# Altium schematic symbol library LATTICEPLDS_Library.SchLib: 291 symbols (part 14 of 32)
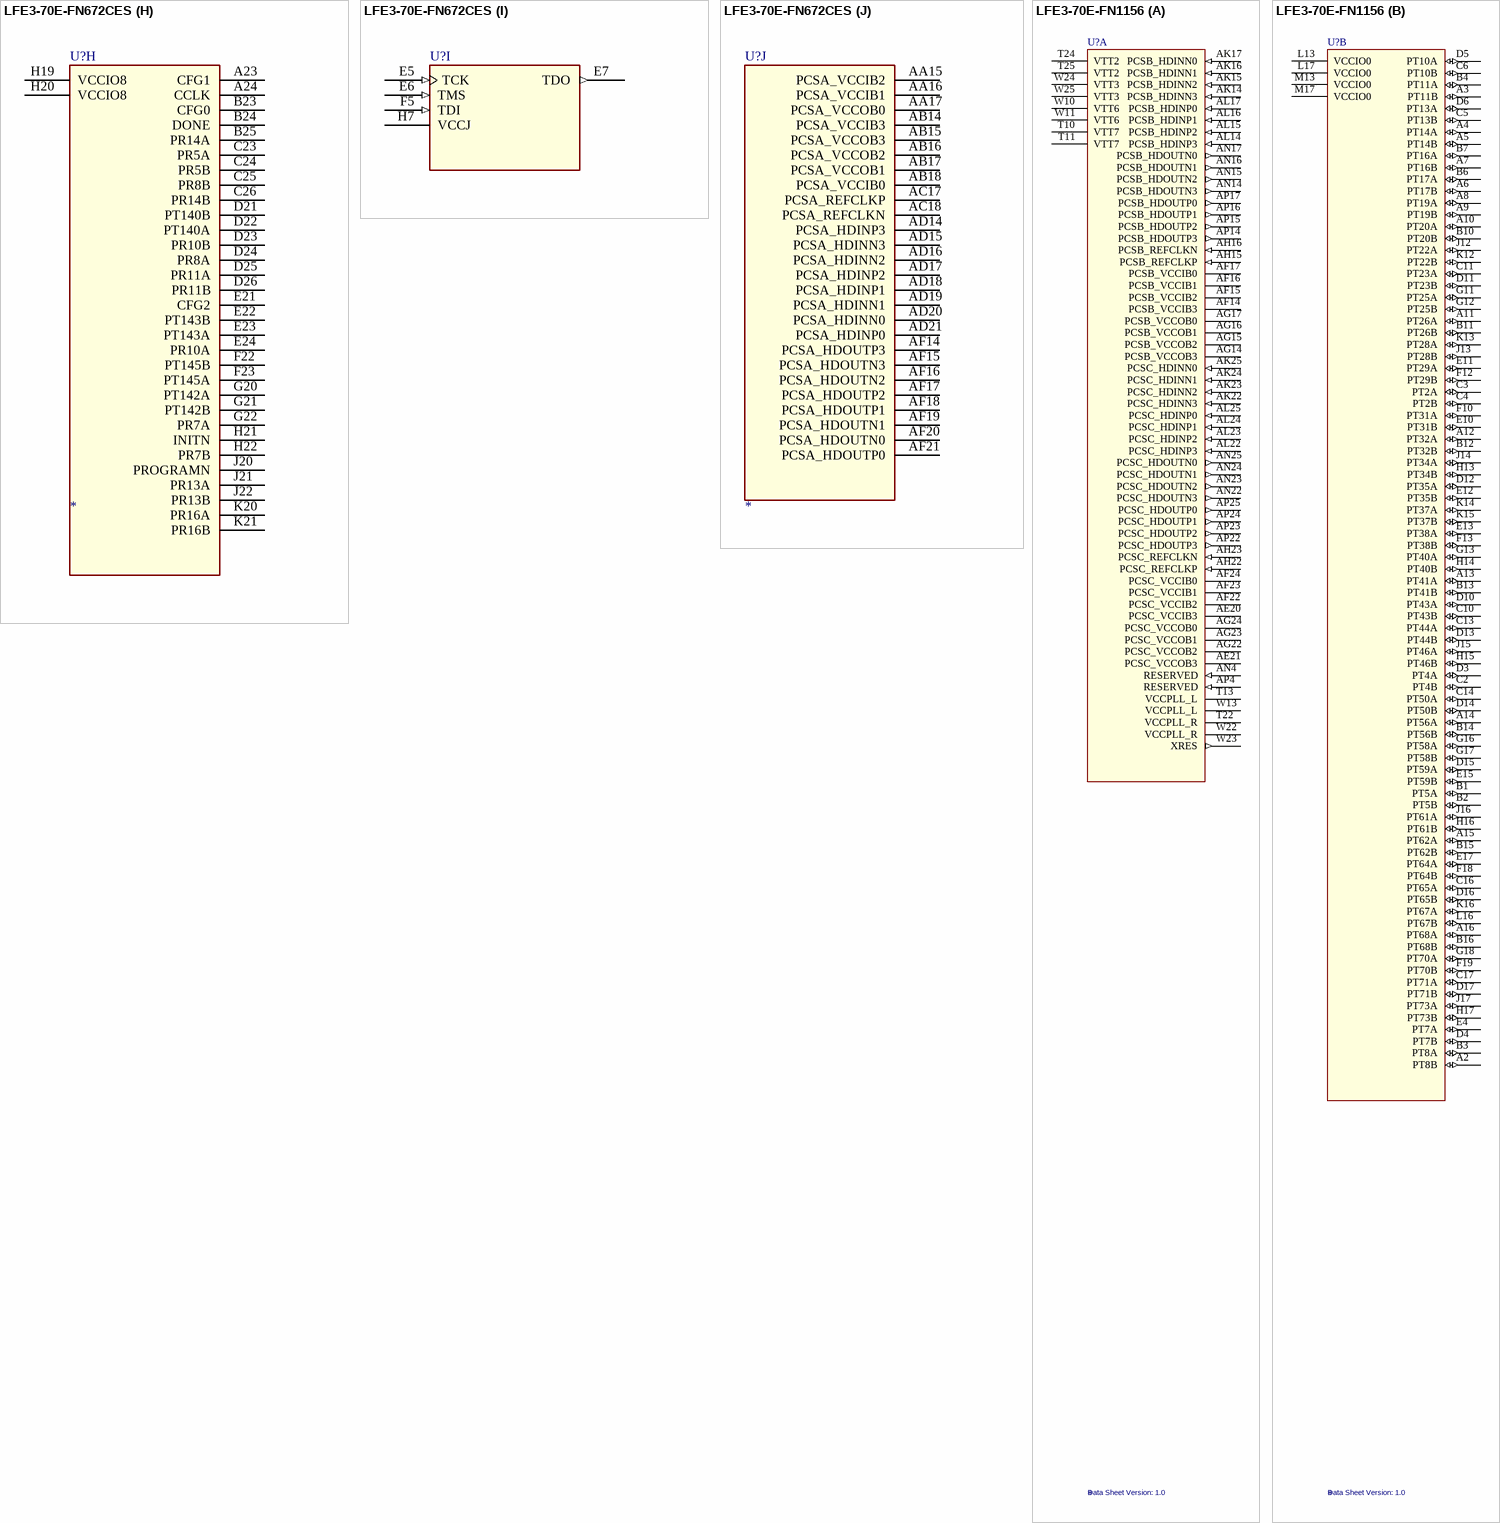
[diagram p316: symbols LFE3-70E-FN672CES to LFE3-70E-FN1156]

## LFE3-70E-FN672CES
designator U?  Data Sheet Version: 1.0
SPLIT_INST: TRUE; SWAP_INFO: (S1+S2+S3+S4+S5+S6+S7+S8+S9+S10)
part A pins: A2 GND (power), A25 GND (power), AA6 GND (power), AA8 GND (power), AA9 GND (power), AA10 PCSB_VCCOB3, AA11 PCSB_VCCIB2, AA12 PCSB_VCCOB1, AA13 GND (power), AA14 GND (power), AA18 GND (power), AA19 GND (power), AA21 GND (power), AB2 GND (power), AB8 GND (power), AB9 PCSB_VCCIB3, AB10 PCSB_VCCOB2, AB11 PCSB_VCCIB1, AB12 PCSB_VCCOB0, AB13 PCSB_VCCIB0, AB19 GND (power), AB25 GND (power), AC5 GND (power), AC6 GND (power), AC7 GND (power), AC8 GND (power), AC9 PCSB_REFCLKP, AC10 PCSB_REFCLKN, AC11 GND (power), AC12 GND (power), AC13 GND (power), AC14 GND (power), AC15 GND (power), AC16 GND (power), AC19 GND (power), AC20 GND (power), AC21 GND (power), AC22 GND (power), AD5 GND (power), AD6 PCSB_HDINP3, AD7 PCSB_HDINN3, AD8 PCSB_HDINN2, AD9 PCSB_HDINP2, AD10 PCSB_HDINP1, AD11 PCSB_HDINN1, AD12 PCSB_HDINN0, AD13 PCSB_HDINP0, AD22 GND (power), AE1 GND (power), AE5 GND (power), AE6 GND (power), AE7 GND (power), AE8 GND (power), AE9 GND (power), AE10 GND (power), AE11 GND (power), AE12 GND (power), AE13 GND (power), AE14 GND (power), AE15 GND (power), AE16 GND (power), AE17 GND (power), AE18 GND (power), AE19 GND (power), AE20 GND (power), AE21 GND (power), AE22 GND (power), AE26 GND (power), AF2 GND (power), AF5 GND (power), AF6 PCSB_HDOUTP3, AF7 PCSB_HDOUTN3, AF8 PCSB_HDOUTN2, AF9 PCSB_HDOUTP2, AF10 PCSB_HDOUTP1, AF11 PCSB_HDOUTN1, AF12 PCSB_HDOUTN0, AF13 PCSB_HDOUTP0, AF22 GND (power), AF25 GND (power), B1 GND (power), B5 GND (power), B9 GND (power), B14 GND (power), B18 GND (power), B22 GND (power), B26 GND (power), D7 GND (power), D11 GND (power), D16 GND (power), D20 GND (power), E2 GND (power), E25 GND (power), F6 GND (power), F21 GND (power), G4 GND (power), G12 GND (power), G15 GND (power), G23 GND (power), H9 GND (power), H18 GND (power), J2 GND (power), J8 GND (power), J9 VCCAUX, J11 VCCAUX, J12 GND (power), J15 GND (power), J16 VCCAUX, J18 VCCAUX, J19 GND (power), J25 GND (power), K10 GND (power), K11 VCC, K12 VCC, K13 VCC, K14 VCC, K15 VCC, K16 VCC, K17 GND (power), L4 GND (power), L9 VCCAUX, L10 VCC, L11 VCC, L12 VCC, L13 GND (power), L14 GND (power), L15 VCC, L16 VCC, L17 VCC, L18 VCCAUX, L23 GND (power), M7 GND (power), M9 GND (power), M10 VCCPLL_L, M11 VCC, M12 GND (power), M13 GND (power), M14 GND (power), M15 GND (power), M16 VCC, M17 VCCPLL_R, M18 GND (power), M20 GND (power), N2 GND (power), N7 VTT7 (power), N10 VCC, N11 GND (power), N12 GND (power), N13 GND (power), N14 GND (power), N15 GND (power), N16 GND (power), N17 VCC, N20 VTT2 (power), P7 VTT6 (power), P10 VCC, P11 GND (power), P12 GND (power), P13 GND (power), P14 GND (power), P15 GND (power), P16 GND (power), P17 VCC, P20 VTT3 (power), P25 GND (power), R7 GND (power), R9 GND (power), R10 VCCPLL_L, R11 VCC, R12 GND (power), R13 GND (power), R14 GND (power), R15 GND (power), R16 VCC, R17 VCCPLL_R, R18 XRES, R20 GND (power), T4 GND (power), T9 VCCAUX, T10 VCC, T11 VCC, T12 VCC, T13 GND (power), T14 GND (power), T15 VCC, T16 VCC, T17 VCC, T18 VCCAUX, T19 GND (power), T23 GND (power), U10 RESERVED, U11 VCC, U12 VCC, U13 VCC, U14 VCC, U15 VCC, U16 VCC, U17 GND (power), V2 GND (power), V8 RESERVED, V9 VCCAUX, V11 VCCAUX, V12 GND (power), V13 VCCA, V14 VCCA, V15 GND (power), V16 VCCAUX, V18 VCCAUX, V19 GND (power), V25 GND (power), W11 GND (power), W12 VCCA, W13 VCCA, W14 VCCA, W15 VCCA, W16 GND (power), Y4 GND (power), Y9 GND (power), Y10 GND (power), Y11 GND (power), Y12 GND (power), Y13 VCCA, Y14 VCCA, Y15 GND (power), Y16 GND (power), Y17 GND (power), Y18 GND (power), Y23 GND (power)
part B pins: A3 PT11A, A4 PT11B, A5 PT17A, A6 PT17B, A7 PT14B, A8 PT41A, A9 PT56A, A10 PT59A, A11 PT59B, A12 PT65A, A13 PT68A, A14 PT68B, A15 PT71A, A16 PT71B, B4 PT7B, B6 PT2A, B7 PT14A, B8 PT41B, B10 PT56B, B11 PT62A, B12 PT62B, B13 PT65B, C4 PT4B, C5 PT7A, C6 PT5B, C7 PT2B, C8 PT8B, C9 PT44A, C10 PT44B, C11 PT61B, C12 PT67A, C13 PT67B, D5 PT4A, D6 PT5A, D8 PT8A, D9 PT38A, D10 PT38B, D12 PT61A, D13 PT73B, E8 PT16A, E9 PT16B, E10 PT40B, E11 PT64A, E12 PT64B, E13 PT73A, F7 PT13A, F8 PT13B, F9 PT19B, F10 PT40A, F11 PT58A, F12 PT70A, G7 PT10A, G8 PT19A, G9 PT43B, G10 PT43A, G11 PT58B, G13 PT70B, H8 PT10B, H10 PT46A, H11 PT46B, H12 VCCIO0 (power), H13 VCCIO0 (power), J10 VCCIO0 (power), J13 VCCIO0 (power)
part C pins: A17 PT80A, A18 PT80B, A19 PT83A, A20 PT83B, A21 PT86A, A22 PT131B, B15 PT74B, B16 PT77A, B17 PT82A, B19 PT89B, B20 PT86B, B21 PT131A, C14 PT76A, C15 PT74A, C16 PT77B, C17 PT82B, C18 PT107A, C19 PT104A, C20 PT89A, C21 PT134B, C22 PT134A, D14 PT76B, D15 PT91A, D17 PT130B, D18 PT107B, D19 PT104B, E14 PT85A, E15 PT85B, E16 PT91B, E17 PT101A, E18 PT130A, E19 PT128A, E20 PT128B, F13 PT79A, F14 PT79B, F15 PT88B, F16 PT103B, F17 PT109A, F18 PT101B, F19 PT133A, F20 PT133B, G14 PT88A, G16 PT103A, G17 PT109B, G18 PT136A, G19 PT136B, H14 VCCIO1 (power), H15 VCCIO1 (power), H16 PT106A, H17 PT106B, J14 VCCIO1 (power), J17 VCCIO1 (power)
part D pins: E26 PR25E_B, F24 PR22A, F25 PR25E_A, F26 PR20B, G24 PR22B, G25 PR26B, G26 PR20A, H23 PR19B, H24 PR26A, H25 PR23B, H26 PR23A, J23 PR19A, J24 PR29B, J26 PR35A, K18 VCCIO2 (power), K19 PR38A, K22 PR25B, K23 PR25A, K24 PR29A, K25 PR32B, K26 PR35B, L19 PR38B, L20 PR28A, L21 PR25E_C, L22 PR25E_D, L24 PR32A, L25 PR41A, L26 PR41B, M19 VCCIO2 (power), M21 PR28B, M22 PR34A, M23 PR31A, M24 PR31B, M25 PR43E_A, M26 PR43E_B, N18 VCCIO2 (power), N19 VCCIO2 (power), N21 PR34B, N22 PR37B, N23 PR37A, P21 PR43A, P22 PR43B, P23 PR40A, R21 PR43E_D, R22 PR40B, T21 PR43E_C
part E pins: AA20 PB145B, AA22 PR94B, AA23 PR88B, AA24 PR88A, AA25 PR80A, AA26 PR83A, AB20 PB139A, AB21 PB139B, AB22 PB143B, AB23 PB143A, AB24 PR92A, AB26 PR83B, AC23 PB137B, AC24 PR92B, AC25 PR89B, AC26 PR89A, AD23 PB137A, AD24 PR97A, AD25 PR86B, AD26 PR86A, AE23 PB140B, AE24 PR97B, AE25 PR95A, AF23 PB140A, AF24 PR95B, N24 PR44A, N25 PR44B, N26 PR50A, P18 VCCIO3 (power), P19 VCCIO3 (power), P24 PR47A, P26 PR50B, R19 VCCIO3 (power), R23 PR49A, R24 PR47B, R25 PR53A, R26 PR53B, T20 PR52A, T22 PR49B, T24 PR56B, T25 PR56A, T26 PR59A, U18 VCCIO3 (power), U19 PR46B, U20 PR46A, U21 PR52B, U22 PR61B, U23 PR61A, U24 PR55A, U25 PR61E_A, U26 PR59B, V17 PR79E_C, V20 PR61E_C, V21 PR58A, V22 PR58B, V23 PR79E_A, V24 PR55B, V26 PR61E_B, W17 PB142A, W18 PR79E_D, W19 PR61E_D, W20 PR85B, W21 PR85A, W22 PR82B, W23 PR82A, W24 PR79E_B, W25 PR70E_B, W26 PR70E_A, Y19 PR91A, Y20 PR91B, Y21 PB145A, Y22 PR94A, Y24 PR80B, Y25 PR70E_D, Y26 PR70E_C
part F pins: AA1 PL80A, AA2 PL80B, AA3 PL89A, AA4 PL89B, AA5 PL88B, AA7 PB4A, AB1 PL83A, AB3 PL92A, AB4 PL92B, AB5 PL91A, AB6 PL91B, AB7 PB4B, AC1 PL83B, AC2 PL86A, AC3 PL86B, AC4 PB5B, AD1 PL95A, AD2 PL95B, AD3 PB5A, AD4 PB2A, AE2 PB8A, AE3 PB2B, AE4 PB11A, AF3 PB8B, AF4 PB11B, N3 PL49A, N5 PL46A, N6 PL46B, P1 PL44A, P2 PL44B, P3 PL49B, P4 PL53A, P5 PL52A, P6 PL52B, P8 VCCIO6 (power), P9 VCCIO6 (power), R1 PL47A, R2 PL47B, R3 PL53B, R4 PL58B, R5 PL55A, R6 PL55B, R8 VCCIO6 (power), T1 PL56A, T2 PL50A, T3 PL58A, T5 PL64A, T6 PL64B, T7 PL61A, T8 PL61B, U1 PL56B, U2 PL59B, U3 PL50B, U4 PL61E_C, U5 PL70E_D, U6 PL70E_C, U7 PL79E_C, U8 PL79E_D, U9 VCCIO6 (power), V1 PL59A, V3 PL65A, V4 PL65B, V5 PL61E_D, V6 PL82A, V7 PL82B, V10 PB13A, W1 PL61E_A, W2 PL61E_B, W3 PL62B, W4 PL70E_A, W5 PL70E_B, W6 PL85B, W7 PL85A, W8 PL97A, W9 PL97B, W10 PB13B, Y1 PL79E_A, Y2 PL79E_B, Y3 PL62A, Y5 PL88A, Y6 PL94A, Y7 PL94B, Y8 PB10A
part G pins: B2 PL8A, B3 PL8B, C1 PL29B, C2 PL17A, C3 PL11A, D1 PL29A, D2 PL17B, D3 PL11B, D4 PL10A, E1 PL32A, E3 PL14A, E4 PL10B, F1 PL32B, F2 PL20A, F3 PL20B, F4 PL14B, G1 PL35B, G2 PL23A, G3 PL23B, G5 PL13A, G6 PL13B, H1 PL38A, H2 PL35A, H3 PL25E_B, H4 PL25E_A, H5 PL25A, H6 PL16A, J1 PL38B, J3 PL28B, J4 PL28A, J5 PL25B, J6 PL16B, J7 PL19B, K1 PL26B, K2 PL26A, K3 PL37A, K4 PL31A, K5 PL31B, K6 PL22B, K7 PL22A, K8 PL19A, K9 VCCIO7 (power), L1 PL41B, L2 PL41A, L3 PL37B, L5 PL34A, L6 PL34B, L7 PL25E_D, L8 PL25E_C, M1 PL43E_A, M2 PL43E_D, M3 PL43E_C, M4 PL43A, M5 PL40A, M6 PL40B, M8 VCCIO7 (power), N1 PL43E_B, N4 PL43B, N8 VCCIO7 (power), N9 VCCIO7 (power)
part H pins: A23 CFG1, A24 CCLK, B23 CFG0, B24 DONE, B25 PR14A, C23 PR5A, C24 PR5B, C25 PR8B, C26 PR14B, D21 PT140B, D22 PT140A, D23 PR10B, D24 PR8A, D25 PR11A, D26 PR11B, E21 CFG2, E22 PT143B, E23 PT143A, E24 PR10A, F22 PT145B, F23 PT145A, G20 PT142A, G21 PT142B, G22 PR7A, H19 VCCIO8 (power), H20 VCCIO8 (power), H21 INITN, H22 PR7B, J20 PROGRAMN, J21 PR13A, J22 PR13B, K20 PR16A, K21 PR16B
part I pins: E5 TCK (in), E6 TMS (in), E7 TDO (out), F5 TDI (in), H7 VCCJ (power)
part J pins: AA15 PCSA_VCCIB2, AA16 PCSA_VCCIB1, AA17 PCSA_VCCOB0, AB14 PCSA_VCCIB3, AB15 PCSA_VCCOB3, AB16 PCSA_VCCOB2, AB17 PCSA_VCCOB1, AB18 PCSA_VCCIB0, AC17 PCSA_REFCLKP, AC18 PCSA_REFCLKN, AD14 PCSA_HDINP3, AD15 PCSA_HDINN3, AD16 PCSA_HDINN2, AD17 PCSA_HDINP2, AD18 PCSA_HDINP1, AD19 PCSA_HDINN1, AD20 PCSA_HDINN0, AD21 PCSA_HDINP0, AF14 PCSA_HDOUTP3, AF15 PCSA_HDOUTN3, AF16 PCSA_HDOUTN2, AF17 PCSA_HDOUTP2, AF18 PCSA_HDOUTP1, AF19 PCSA_HDOUTN1, AF20 PCSA_HDOUTN0, AF21 PCSA_HDOUTP0

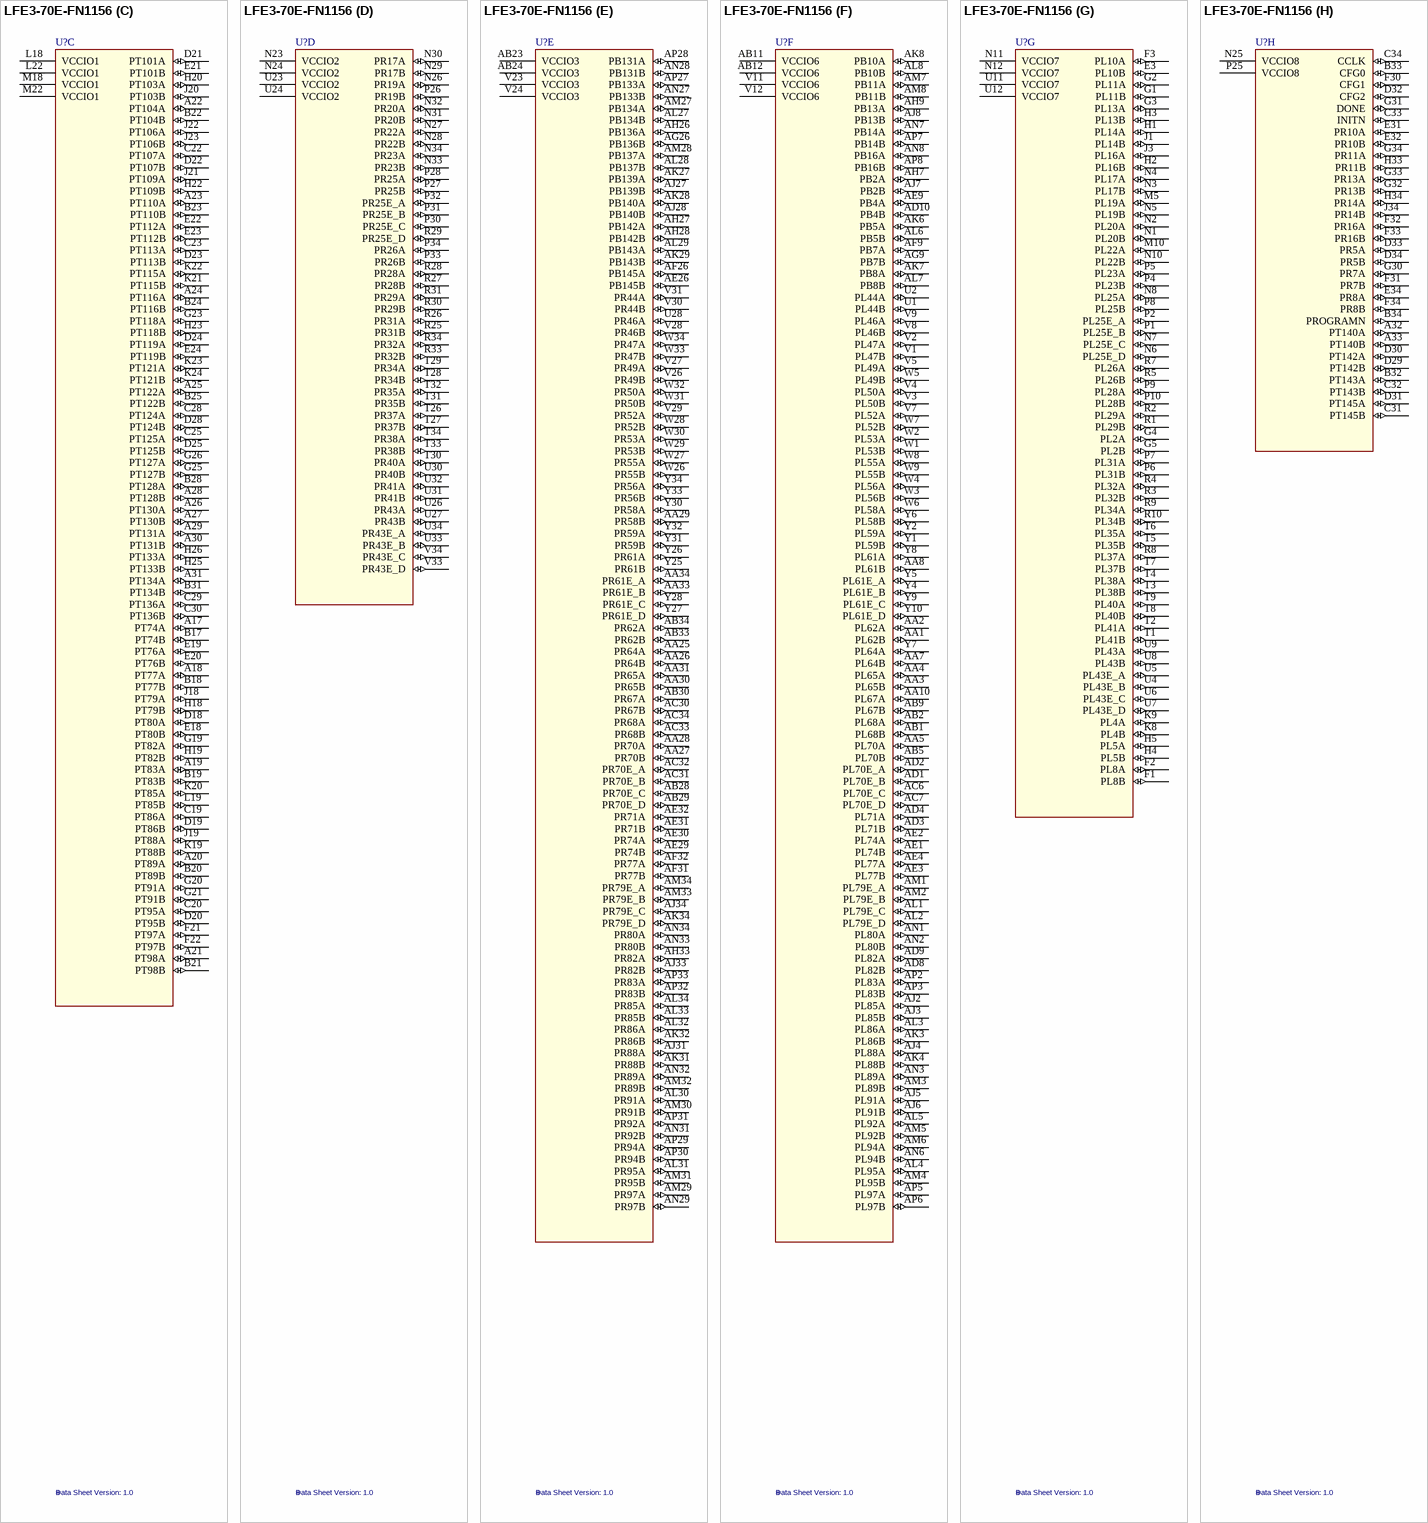
[diagram p138: symbol LFE3-70E-FN1156]

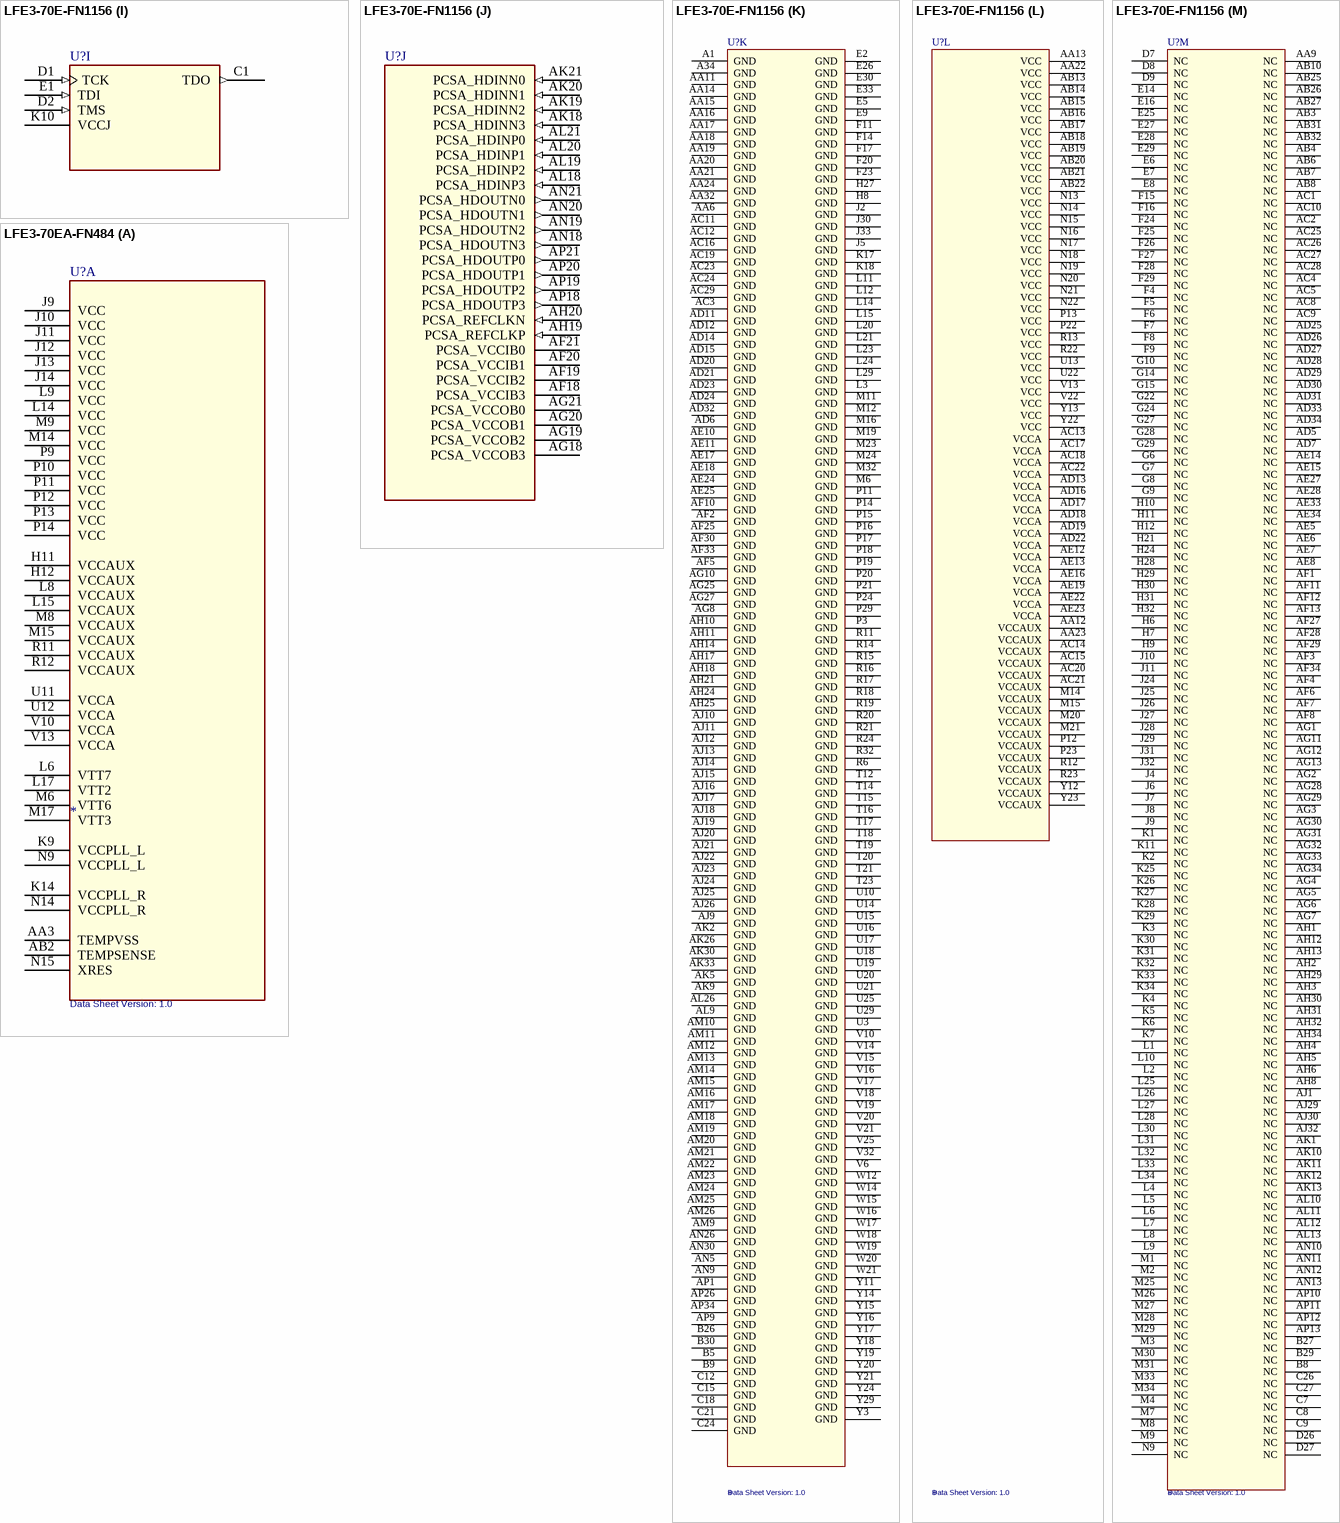
[diagram p139: symbols LFE3-70E-FN1156 to LFE3-70EA-FN484]

## LFE3-70E-FN1156
designator U?  Data Sheet Version: 1.0
SPLIT_INST: TRUE; SWAP_INFO: (S1+S2+S3+S4+S5+S6+S7+S8+S9+S10+S11+S12+S13)
part A pins: AE20 PCSC_VCCIB3 (power), AE21 PCSC_VCCOB3 (power), AF14 PCSB_VCCIB3 (power), AF15 PCSB_VCCIB2 (power), AF16 PCSB_VCCIB1 (power), AF17 PCSB_VCCIB0 (power), AF22 PCSC_VCCIB2 (power), AF23 PCSC_VCCIB1 (power), AF24 PCSC_VCCIB0 (power), AG14 PCSB_VCCOB3 (power), AG15 PCSB_VCCOB2 (power), AG16 PCSB_VCCOB1 (power), AG17 PCSB_VCCOB0 (power), AG22 PCSC_VCCOB2 (power), AG23 PCSC_VCCOB1 (power), AG24 PCSC_VCCOB0 (power), AH15 PCSB_REFCLKP (in), AH16 PCSB_REFCLKN (in), AH22 PCSC_REFCLKP (in), AH23 PCSC_REFCLKN (in), AK14 PCSB_HDINN3 (in), AK15 PCSB_HDINN2 (in), AK16 PCSB_HDINN1 (in), AK17 PCSB_HDINN0 (in), AK22 PCSC_HDINN3 (in), AK23 PCSC_HDINN2 (in), AK24 PCSC_HDINN1 (in), AK25 PCSC_HDINN0 (in), AL14 PCSB_HDINP3 (in), AL15 PCSB_HDINP2 (in), AL16 PCSB_HDINP1 (in), AL17 PCSB_HDINP0 (in), AL22 PCSC_HDINP3 (in), AL23 PCSC_HDINP2 (in), AL24 PCSC_HDINP1 (in), AL25 PCSC_HDINP0 (in), AN4 RESERVED (in), AN14 PCSB_HDOUTN3 (out), AN15 PCSB_HDOUTN2 (out), AN16 PCSB_HDOUTN1 (out), AN17 PCSB_HDOUTN0 (out), AN22 PCSC_HDOUTN3 (out), AN23 PCSC_HDOUTN2 (out), AN24 PCSC_HDOUTN1 (out), AN25 PCSC_HDOUTN0 (out), AP4 RESERVED (in), AP14 PCSB_HDOUTP3 (out), AP15 PCSB_HDOUTP2 (out), AP16 PCSB_HDOUTP1 (out), AP17 PCSB_HDOUTP0 (out), AP22 PCSC_HDOUTP3 (out), AP23 PCSC_HDOUTP2 (out), AP24 PCSC_HDOUTP1 (out), AP25 PCSC_HDOUTP0 (out), T10 VTT7 (power), T11 VTT7 (power), T13 VCCPLL_L (power), T22 VCCPLL_R (power), T24 VTT2 (power), T25 VTT2 (power), W10 VTT6 (power), W11 VTT6 (power), W13 VCCPLL_L (power), W22 VCCPLL_R (power), W23 XRES (out), W24 VTT3 (power), W25 VTT3 (power)
part B pins: A2 PT8B (io), A3 PT11B (io), A4 PT14A (io), A5 PT14B (io), A6 PT17B (io), A7 PT16B (io), A8 PT19A (io), A9 PT19B (io), A10 PT20A (io), A11 PT26A (io), A12 PT32A (io), A13 PT41A (io), A14 PT56A (io), A15 PT62A (io), A16 PT68A (io), B1 PT5A (io), B2 PT5B (io), B3 PT8A (io), B4 PT11A (io), B6 PT17A (io), B7 PT16A (io), B10 PT20B (io), B11 PT26B (io), B12 PT32B (io), B13 PT41B (io), B14 PT56B (io), B15 PT62B (io), B16 PT68B (io), C2 PT4B (io), C3 PT2A (io), C4 PT2B (io), C5 PT13B (io), C6 PT10B (io), C10 PT43B (io), C11 PT23A (io), C13 PT44A (io), C14 PT50A (io), C16 PT65A (io), C17 PT71A (io), D3 PT4A (io), D4 PT7B (io), D5 PT10A (io), D6 PT13A (io), D10 PT43A (io), D11 PT23B (io), D12 PT35A (io), D13 PT44B (io), D14 PT50B (io), D15 PT59A (io), D16 PT65B (io), D17 PT71B (io), E4 PT7A (io), E10 PT31B (io), E11 PT29A (io), E12 PT35B (io), E13 PT38A (io), E15 PT59B (io), E17 PT64A (io), F10 PT31A (io), F12 PT29B (io), F13 PT38B (io), F18 PT64B (io), F19 PT70B (io), G11 PT25A (io), G12 PT25B (io), G13 PT40A (io), G16 PT58A (io), G17 PT58B (io), G18 PT70A (io), H13 PT34B (io), H14 PT40B (io), H15 PT46B (io), H16 PT61B (io), H17 PT73B (io), J12 PT22A (io), J13 PT28B (io), J14 PT34A (io), J15 PT46A (io), J16 PT61A (io), J17 PT73A (io), K12 PT22B (io), K13 PT28A (io), K14 PT37A (io), K15 PT37B (io), K16 PT67A (io), L13 VCCIO0 (power), L16 PT67B (io), L17 VCCIO0 (power), M13 VCCIO0 (power), M17 VCCIO0 (power)
part C pins: A17 PT74A (io), A18 PT77A (io), A19 PT83A (io), A20 PT89A (io), A21 PT98A (io), A22 PT104A (io), A23 PT110A (io), A24 PT116A (io), A25 PT122A (io), A26 PT130A (io), A27 PT130B (io), A28 PT128B (io), A29 PT131A (io), A30 PT131B (io), A31 PT134A (io), B17 PT74B (io), B18 PT77B (io), B19 PT83B (io), B20 PT89B (io), B21 PT98B (io), B22 PT104B (io), B23 PT110B (io), B24 PT116B (io), B25 PT122B (io), B28 PT128A (io), B31 PT134B (io), C19 PT86A (io), C20 PT95A (io), C22 PT107A (io), C23 PT113A (io), C25 PT125A (io), C28 PT124A (io), C29 PT136A (io), C30 PT136B (io), D18 PT80A (io), D19 PT86B (io), D20 PT95B (io), D21 PT101A (io), D22 PT107B (io), D23 PT113B (io), D24 PT119A (io), D25 PT125B (io), D28 PT124B (io), E18 PT80B (io), E19 PT76A (io), E20 PT76B (io), E21 PT101B (io), E22 PT112A (io), E23 PT112B (io), E24 PT119B (io), F21 PT97A (io), F22 PT97B (io), G19 PT82A (io), G20 PT91A (io), G21 PT91B (io), G23 PT118A (io), G25 PT127B (io), G26 PT127A (io), H18 PT79B (io), H19 PT82B (io), H20 PT103A (io), H22 PT109B (io), H23 PT118B (io), H25 PT133B (io), H26 PT133A (io), J18 PT79A (io), J19 PT88A (io), J20 PT103B (io), J21 PT109A (io), J22 PT106A (io), J23 PT106B (io), K19 PT88B (io), K20 PT85A (io), K21 PT115B (io), K22 PT115A (io), K23 PT121A (io), K24 PT121B (io), L18 VCCIO1 (power), L19 PT85B (io), L22 VCCIO1 (power), M18 VCCIO1 (power), M22 VCCIO1 (power)
part D pins: N23 VCCIO2 (power), N24 VCCIO2 (power), N26 PR19A (io), N27 PR22A (io), N28 PR22B (io), N29 PR17B (io), N30 PR17A (io), N31 PR20B (io), N32 PR20A (io), N33 PR23B (io), N34 PR23A (io), P26 PR19B (io), P27 PR25B (io), P28 PR25A (io), P30 PR25E_C (io), P31 PR25E_B (io), P32 PR25E_A (io), P33 PR26B (io), P34 PR26A (io), R25 PR31B (io), R26 PR31A (io), R27 PR28B (io), R28 PR28A (io), R29 PR25E_D (io), R30 PR29B (io), R31 PR29A (io), R33 PR32B (io), R34 PR32A (io), T26 PR37A (io), T27 PR37B (io), T28 PR34B (io), T29 PR34A (io), T30 PR40A (io), T31 PR35B (io), T32 PR35A (io), T33 PR38B (io), T34 PR38A (io), U23 VCCIO2 (power), U24 VCCIO2 (power), U26 PR43A (io), U27 PR43B (io), U30 PR40B (io), U31 PR41B (io), U32 PR41A (io), U33 PR43E_B (io), U34 PR43E_A (io), V33 PR43E_D (io), V34 PR43E_C (io)
part E pins: AA25 PR64A (io), AA26 PR64B (io), AA27 PR70B (io), AA28 PR70A (io), AA29 PR58B (io), AA30 PR65B (io), AA31 PR65A (io), AA33 PR61E_B (io), AA34 PR61E_A (io), AB23 VCCIO3 (power), AB24 VCCIO3 (power), AB28 PR70E_C (io), AB29 PR70E_D (io), AB30 PR67A (io), AB33 PR62B (io), AB34 PR62A (io), AC30 PR67B (io), AC31 PR70E_B (io), AC32 PR70E_A (io), AC33 PR68B (io), AC34 PR68A (io), AE26 PB145B (io), AE29 PR74B (io), AE30 PR74A (io), AE31 PR71B (io), AE32 PR71A (io), AF26 PB145A (io), AF31 PR77B (io), AF32 PR77A (io), AG26 PB136B (io), AH26 PB136A (io), AH27 PB142A (io), AH28 PB142B (io), AH33 PR82A (io), AJ27 PB139B (io), AJ28 PB140B (io), AJ31 PR88A (io), AJ33 PR82B (io), AJ34 PR79E_C (io), AK27 PB139A (io), AK28 PB140A (io), AK29 PB143B (io), AK31 PR88B (io), AK32 PR86B (io), AK34 PR79E_D (io), AL27 PB134B (io), AL28 PB137B (io), AL29 PB143A (io), AL30 PR91A (io), AL31 PR95A (io), AL32 PR86A (io), AL33 PR85B (io), AL34 PR85A (io), AM27 PB134A (io), AM28 PB137A (io), AM29 PR97A (io), AM30 PR91B (io), AM31 PR95B (io), AM32 PR89B (io), AM33 PR79E_B (io), AM34 PR79E_A (io), AN27 PB133B (io), AN28 PB131B (io), AN29 PR97B (io), AN31 PR92B (io), AN32 PR89A (io), AN33 PR80B (io), AN34 PR80A (io), AP27 PB133A (io), AP28 PB131A (io), AP29 PR94A (io), AP30 PR94B (io), AP31 PR92A (io), AP32 PR83B (io), AP33 PR83A (io), U28 PR46A (io), V23 VCCIO3 (power), V24 VCCIO3 (power), V26 PR49B (io), V27 PR49A (io), V28 PR46B (io), V29 PR52A (io), V30 PR44B (io), V31 PR44A (io), W26 PR55B (io), W27 PR55A (io), W28 PR52B (io), W29 PR53B (io), W30 PR53A (io), W31 PR50B (io), W32 PR50A (io), W33 PR47B (io), W34 PR47A (io), Y25 PR61B (io), Y26 PR61A (io), Y27 PR61E_D (io), Y28 PR61E_C (io), Y30 PR58A (io), Y31 PR59B (io), Y32 PR59A (io), Y33 PR56B (io), Y34 PR56A (io)
part F pins: AA1 PL62B (io), AA2 PL62A (io), AA3 PL65B (io), AA4 PL65A (io), AA5 PL70A (io), AA7 PL64B (io), AA8 PL61B (io), AA10 PL67A (io), AB1 PL68B (io), AB2 PL68A (io), AB5 PL70B (io), AB9 PL67B (io), AB11 VCCIO6 (power), AB12 VCCIO6 (power), AC6 PL70E_C (io), AC7 PL70E_D (io), AD1 PL70E_B (io), AD2 PL70E_A (io), AD3 PL71B (io), AD4 PL71A (io), AD8 PL82B (io), AD9 PL82A (io), AD10 PB4B (io), AE1 PL74B (io), AE2 PL74A (io), AE3 PL77B (io), AE4 PL77A (io), AE9 PB4A (io), AF9 PB7A (io), AG9 PB7B (io), AH7 PB2A (io), AH9 PB13A (io), AJ2 PL85A (io), AJ3 PL85B (io), AJ4 PL88A (io), AJ5 PL91A (io), AJ6 PL91B (io), AJ7 PB2B (io), AJ8 PB13B (io), AK3 PL86B (io), AK4 PL88B (io), AK6 PB5A (io), AK7 PB8A (io), AK8 PB10A (io), AL1 PL79E_C (io), AL2 PL79E_D (io), AL3 PL86A (io), AL4 PL95A (io), AL5 PL92A (io), AL6 PB5B (io), AL7 PB8B (io), AL8 PB10B (io), AM1 PL79E_A (io), AM2 PL79E_B (io), AM3 PL89B (io), AM4 PL95B (io), AM5 PL92B (io), AM6 PL94A (io), AM7 PB11A (io), AM8 PB11B (io), AN1 PL80A (io), AN2 PL80B (io), AN3 PL89A (io), AN6 PL94B (io), AN7 PB14A (io), AN8 PB16A (io), AP2 PL83A (io), AP3 PL83B (io), AP5 PL97A (io), AP6 PL97B (io), AP7 PB14B (io), AP8 PB16B (io), U1 PL44B (io), U2 PL44A (io), V1 PL47B (io), V2 PL47A (io), V3 PL50B (io), V4 PL50A (io), V5 PL49A (io), V7 PL52A (io), V8 PL46B (io), V9 PL46A (io), V11 VCCIO6 (power), V12 VCCIO6 (power), W1 PL53B (io), W2 PL53A (io), W3 PL56B (io), W4 PL56A (io), W5 PL49B (io), W6 PL58A (io), W7 PL52B (io), W8 PL55A (io), W9 PL55B (io), Y1 PL59B (io), Y2 PL59A (io), Y4 PL61E_B (io), Y5 PL61E_A (io), Y6 PL58B (io), Y7 PL64A (io), Y8 PL61A (io), Y9 PL61E_C (io), Y10 PL61E_D (io)
part G pins: E3 PL10B (io), F1 PL8B (io), F2 PL8A (io), F3 PL10A (io), G1 PL11B (io), G2 PL11A (io), G3 PL13A (io), G4 PL2A (io), G5 PL2B (io), H1 PL14A (io), H2 PL16B (io), H3 PL13B (io), H4 PL5B (io), H5 PL5A (io), J1 PL14B (io), J3 PL16A (io), K8 PL4B (io), K9 PL4A (io), M5 PL19A (io), M10 PL22A (io), N1 PL20B (io), N2 PL20A (io), N3 PL17B (io), N4 PL17A (io), N5 PL19B (io), N6 PL25E_D (io), N7 PL25E_C (io), N8 PL25A (io), N10 PL22B (io), N11 VCCIO7 (power), N12 VCCIO7 (power), P1 PL25E_B (io), P2 PL25E_A (io), P4 PL23B (io), P5 PL23A (io), P6 PL31B (io), P7 PL31A (io), P8 PL25B (io), P9 PL28A (io), P10 PL28B (io), R1 PL29B (io), R2 PL29A (io), R3 PL32B (io), R4 PL32A (io), R5 PL26B (io), R7 PL26A (io), R8 PL37A (io), R9 PL34A (io), R10 PL34B (io), T1 PL41B (io), T2 PL41A (io), T3 PL38B (io), T4 PL38A (io), T5 PL35B (io), T6 PL35A (io), T7 PL37B (io), T8 PL40B (io), T9 PL40A (io), U4 PL43E_B (io), U5 PL43E_A (io), U6 PL43E_C (io), U7 PL43E_D (io), U8 PL43B (io), U9 PL43A (io), U11 VCCIO7 (power), U12 VCCIO7 (power)
part H pins: A32 PT140A (io), A33 PT140B (io), B32 PT143A (io), B33 CFG0 (io), B34 PROGRAMN (io), C31 PT145B (io), C32 PT143B (io), C33 INITN (io), C34 CCLK (io), D29 PT142B (io), D30 PT142A (io), D31 PT145A (io), D32 CFG2 (io), D33 PR5A (io), D34 PR5B (io), E31 PR10A (io), E32 PR10B (io), E34 PR8A (io), F30 CFG1 (io), F31 PR7B (io), F32 PR16A (io), F33 PR16B (io), F34 PR8B (io), G30 PR7A (io), G31 DONE (io), G32 PR13B (io), G33 PR13A (io), G34 PR11A (io), H33 PR11B (io), H34 PR14A (io), J34 PR14B (io), N25 VCCIO8 (power), P25 VCCIO8 (power)
part I pins: C1 TDO (out), D1 TCK (in), D2 TMS (in), E1 TDI (in), K10 VCCJ (power)
part J pins: AF18 PCSA_VCCIB3 (power), AF19 PCSA_VCCIB2 (power), AF20 PCSA_VCCIB1 (power), AF21 PCSA_VCCIB0 (power), AG18 PCSA_VCCOB3 (power), AG19 PCSA_VCCOB2 (power), AG20 PCSA_VCCOB1 (power), AG21 PCSA_VCCOB0 (power), AH19 PCSA_REFCLKP (in), AH20 PCSA_REFCLKN (in), AK18 PCSA_HDINN3 (in), AK19 PCSA_HDINN2 (in), AK20 PCSA_HDINN1 (in), AK21 PCSA_HDINN0 (in), AL18 PCSA_HDINP3 (in), AL19 PCSA_HDINP2 (in), AL20 PCSA_HDINP1 (in), AL21 PCSA_HDINP0 (in), AN18 PCSA_HDOUTN3 (out), AN19 PCSA_HDOUTN2 (out), AN20 PCSA_HDOUTN1 (out), AN21 PCSA_HDOUTN0 (out), AP18 PCSA_HDOUTP3 (out), AP19 PCSA_HDOUTP2 (out), AP20 PCSA_HDOUTP1 (out), AP21 PCSA_HDOUTP0 (out)
part K pins: A1 GND (power), A34 GND (power), AA6 GND (power), AA11 GND (power), AA14 GND (power), AA15 GND (power), AA16 GND (power), AA17 GND (power), AA18 GND (power), AA19 GND (power), AA20 GND (power), AA21 GND (power), AA24 GND (power), AA32 GND (power), AC3 GND (power), AC11 GND (power), AC12 GND (power), AC16 GND (power), AC19 GND (power), AC23 GND (power), AC24 GND (power), AC29 GND (power), AD6 GND (power), AD11 GND (power), AD12 GND (power), AD14 GND (power), AD15 GND (power), AD20 GND (power), AD21 GND (power), AD23 GND (power), AD24 GND (power), AD32 GND (power), AE10 GND (power), AE11 GND (power), AE17 GND (power), AE18 GND (power), AE24 GND (power), AE25 GND (power), AF2 GND (power), AF5 GND (power), AF10 GND (power), AF25 GND (power), AF30 GND (power), AF33 GND (power), AG8 GND (power), AG10 GND (power), AG25 GND (power), AG27 GND (power), AH10 GND (power), AH11 GND (power), AH14 GND (power), AH17 GND (power), AH18 GND (power), AH21 GND (power), AH24 GND (power), AH25 GND (power), AJ9 GND (power), AJ10 GND (power), AJ11 GND (power), AJ12 GND (power), AJ13 GND (power), AJ14 GND (power), AJ15 GND (power), AJ16 GND (power), AJ17 GND (power), AJ18 GND (power), AJ19 GND (power), AJ20 GND (power), AJ21 GND (power), AJ22 GND (power), AJ23 GND (power), AJ24 GND (power), AJ25 GND (power), AJ26 GND (power), AK2 GND (power), AK5 GND (power), AK9 GND (power), AK26 GND (power), AK30 GND (power), AK33 GND (power), AL9 GND (power), AL26 GND (power), AM9 GND (power), AM10 GND (power), AM11 GND (power), AM12 GND (power), AM13 GND (power), AM14 GND (power), AM15 GND (power), AM16 GND (power), AM17 GND (power), AM18 GND (power), AM19 GND (power), AM20 GND (power), AM21 GND (power), AM22 GND (power), AM23 GND (power), AM24 GND (power), AM25 GND (power), AM26 GND (power), AN5 GND (power), AN9 GND (power), AN26 GND (power), AN30 GND (power), AP1 GND (power), AP9 GND (power), AP26 GND (power), AP34 GND (power), B5 GND (power), B9 GND (power), B26 GND (power), B30 GND (power), C12 GND (power), C15 GND (power), C18 GND (power), C21 GND (power), C24 GND (power), E2 GND (power), E5 GND (power), E9 GND (power), E26 GND (power), E30 GND (power), E33 GND (power), F11 GND (power), F14 GND (power), F17 GND (power), F20 GND (power), F23 GND (power), H8 GND (power), H27 GND (power), J2 GND (power), J5 GND (power), J30 GND (power), J33 GND (power), K17 GND (power), K18 GND (power), L3 GND (power), L11 GND (power), L12 GND (power), L14 GND (power), L15 GND (power), L20 GND (power), L21 GND (power), L23 GND (power), L24 GND (power), L29 GND (power), M6 GND (power), M11 GND (power), M12 GND (power), M16 GND (power), M19 GND (power), M23 GND (power), M24 GND (power), M32 GND (power), P3 GND (power), P11 GND (power), P14 GND (power), P15 GND (power), P16 GND (power), P17 GND (power), P18 GND (power), P19 GND (power), P20 GND (power), P21 GND (power), P24 GND (power), P29 GND (power), R6 GND (power), R11 GND (power), R14 GND (power), R15 GND (power), R16 GND (power), R17 GND (power), R18 GND (power), R19 GND (power), R20 GND (power), R21 GND (power), R24 GND (power), R32 GND (power), T12 GND (power), T14 GND (power), T15 GND (power), T16 GND (power), T17 GND (power), T18 GND (power), T19 GND (power), T20 GND (power), T21 GND (power), T23 GND (power), U3 GND (power), U10 GND (power), U14 GND (power), U15 GND (power), U16 GND (power), U17 GND (power), U18 GND (power), U19 GND (power), U20 GND (power), U21 GND (power), U25 GND (power), U29 GND (power), V6 GND (power), V10 GND (power), V14 GND (power), V15 GND (power), V16 GND (power), V17 GND (power), V18 GND (power), V19 GND (power), V20 GND (power), V21 GND (power), V25 GND (power), V32 GND (power), W12 GND (power), W14 GND (power), W15 GND (power), W16 GND (power), W17 GND (power), W18 GND (power), W19 GND (power), W20 GND (power), W21 GND (power), Y3 GND (power), Y11 GND (power), Y14 GND (power), Y15 GND (power), Y16 GND (power), Y17 GND (power), Y18 GND (power), Y19 GND (power), Y20 GND (power), Y21 GND (power), Y24 GND (power), Y29 GND (power)